# Altium footprint library 2.50-TO直插元件封装.PcbLib: 59 footprints (part 1 of 4)
Each footprint in its own frame and in the unit in brackets; x right, y up, seen from the top. Pads: shape width x height; smd on the part's side, far side on the other; paste and mask are expansions set on the pad; w line width, h text height; cw(c..) or ccw(c..) is an arc to the next point about the centre after c.
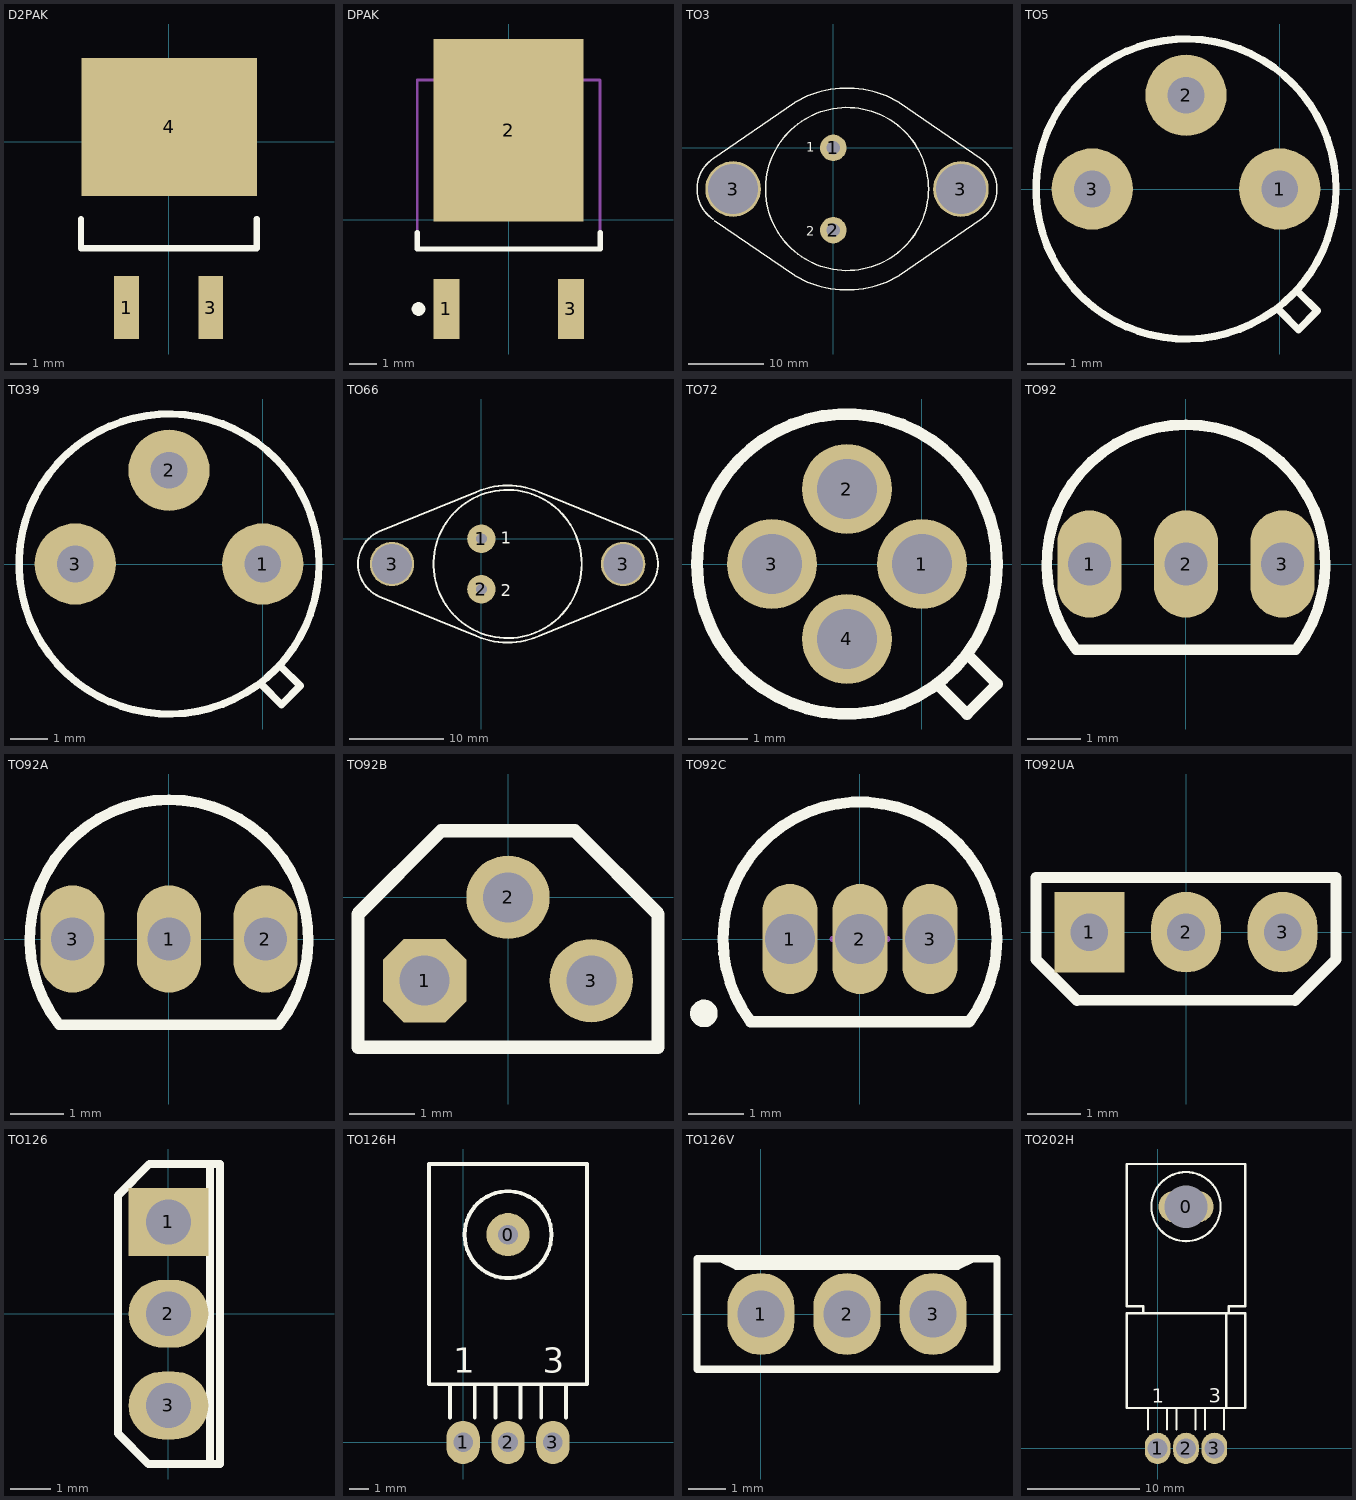
[diagram p0: the footprints below, top view; thin cyan lines are the x and y axes]

## D2PAK [mil] "封装库来自淘宝卖家 ID：黄晶宝石"
pads (3):
  rect 59.06x150 smd: 1(-101,-397) 3(100,-397)
  rect 420x330 smd: 4(1,35)
Top Overlay:
  lines w15: -210,-185 -210,-255 210,-255 210,-185
3D body "TO263-2.STEP": height 200.2, standoff 2.64, extent -199.99,-425.71 200.01,175.23

## DPAK [mm]
pads (3):
  rect 0.95x2.2 smd: 1(-2.28,-3.275) 3(2.28,-3.275)
  rect 5.5x6.7 smd: 2(0,3.275)
Top Overlay:
  circle w0.25: c-3.305,-3.275 r0.125
  lines w0.2: -3.35,-0.475 -3.35,-1.075 3.35,-1.075 3.35,-0.475
Mechanical 13:
  lines w0.1: -3.35,-1.075 -3.35,5.125 3.35,5.125 3.35,-1.075 -3.35,-1.075
Mechanical 15:
  lines w0.1: -0.5,1.125 0.5,1.125 ; 0,0.625 0,1.625
3D body "DPAK_TO-252AA.STEP": height 2.37, standoff -0.03, extent -3.367,-3.939 3.367,6.161

## TO3 [mil] "封装库来自淘宝卖家 ID：黄晶宝石"
pads (4):
  round 137.79 hole 70: 1(0,0) 2(0,-430)
  round 290 hole 262: 3(-523.5,-215) 3(666.5,-215)
Top Overlay:
  circle w7.87: c71.5,-215 r425.69
  lines w7.87: -628.5,-56.67 -203.5,235 ; -627.34,-373.9 cw(c-520.17,-215) -627.34,-56.1 ; -620.17,-381.67 -203.5,-665 ; -200.18,-667.16 ccw(c71.5,-215) 343.18,-667.16 ; -200.18,237.16 cw(c71.5,-215) 343.18,237.16 ; 346.5,-665 771.5,-373.33 ; 346.5,235 771.5,-56.67 ; 770.34,-373.9 ccw(c663.17,-215) 770.34,-56.1
  text "2" at -140,-460 h50
  text "1" at -140,-20 h50

## TO5 [mm] "封装库来自淘宝卖家 ID：黄晶宝石"
pads (3):
  round 2.2 hole 1: 1(0,0) 2(-2.54,2.54) 3(-5.08,0)
Top Overlay:
  circle w0.2: c-2.54,0 r4.064
  lines w0.2: 0,-3.302 0.508,-3.81 1.016,-3.302 0.508,-2.794

## TO39 [mm] "封装库来自淘宝卖家 ID：黄晶宝石"
pads (3):
  round 2.2 hole 1: 1(0,0) 2(-2.54,2.54) 3(-5.08,0)
Top Overlay:
  circle w0.2: c-2.54,0 r4.064
  lines w0.2: 0,-3.302 0.508,-3.81 1.016,-3.302 0.508,-2.794

## TO66 [mil] "封装库来自淘宝卖家 ID：黄晶宝石"
pads (4):
  round 118.11 hole 45: 1(0,0) 2(0,-210)
  round 185 hole 165: 3(-372,-105) 3(590,-105)
Top Overlay:
  circle w7.87: c109,-105 r308.33
  lines w7.87: -426,-240 -21,-405 ; -425.99,-239.75 cw(c-366,-105) -425.99,29.75 ; -426,30 -21,195 ; -18.64,-405.7 ccw(c109,-105) 236.64,-405.7 ; -18.64,195.7 cw(c109,-105) 236.64,195.7 ; 239,-405 644,-240 ; 239,195 644,30 ; 643.63,-240.21 ccw(c589,-105) 643.63,30.21
  text "1" at 80,-20 h50
  text "2" at 80,-240 h50

## TO72 [mil] "封装库来自淘宝卖家 ID：黄晶宝石"
pads (4):
  round 60 hole 40: 1(0,0) 2(-50,50) 3(-100,0) 4(-50,-50)
Top Overlay:
  circle w7.87: c-50,0 r100
  lines w7.87: 10,-80 30,-100 50,-80 30,-60

## TO92 [mm] "TO, Flat Index; 3 In-Line, Axial Leads; Body Dia. 4.8mm; Leads 0.48 x 0.5 mm (max)"
height 5.33
pads (3):
  oval 1.2x2 hole 0.8: 1(-1.8,0) 2(0,0) 3(1.8,0)
Top Overlay:
  lines w0.2: -2.049,-1.601 cw(c0,0) 2.049,-1.601 ; -1.99,-1.6 1.99,-1.6
3D body "TO92A.STEP": height 7.6, standoff -3, extent -2.3,-1.3 2.3,2.3

## TO92A [mm] "TO, Flat Index; 3 In-Line, Axial Leads; Body Dia. 4.8mm; Leads 0.48 x 0.5 mm (max)"
height 5.33
pads (3):
  oval 1.2x2 hole 0.8: 1(0,0) 2(1.8,0) 3(-1.8,0)
Top Overlay:
  lines w0.2: -2.049,-1.601 cw(c0,0) 2.049,-1.601 ; -1.99,-1.6 1.99,-1.6
3D body "TO92A.STEP": height 7.6, standoff -3, extent -2.3,-1.3 2.3,2.3

## TO92B [mil] "92晶体管"
pads (3):
  oct 50x50 hole 30: 1(-50,-50)
  round 50 hole 30: 2(0,0) 3(50,-50)
Top Overlay:
  lines w8: -90,-90 -90,-10 -40,40 40,40 90,-10 90,-90 -90,-90
3D body "TO92B.STEP": height 118.11, standoff -299.21, extent -90.55,-100.99 90.55,40.34

## TO92C [mm] "TO, Flat Index; 3 In-Line, Axial Leads; Body Dia. 4.5mm; Leads 0.51 x 0.48 mm (max)"
height 6.86
pads (3):
  oval 1x2 hole 0.9: 1(-1.27,0) 2(0,0) 3(1.27,0)
Top Overlay:
  circle w0.25: c-2.83,-1.35 r0.125
  lines w0.2: -1.981,-1.5 1.956,-1.5 ; -1.98,-1.5 cw(c0,0) 1.98,-1.5
Mechanical 13:
  lines w0.1: -1.98,-1.5 1.98,-1.5
Mechanical 15:
  lines w0.1: -0.5,0 0.5,0 ; 0,-0.5 0,0.5
3D body "TO-92-2.STEP": height 6.55, standoff -7.65, extent -2.395,-1.524 2.395,2.476

## TO92UA [mm] "92晶体管"
height 5.33
pads (3):
  rect 1.3x1.5 hole 0.7: 1(-1.8,0)
  oval 1.3x1.5 hole 0.7: 2(0,0) 3(1.8,0)
Top Overlay:
  lines w0.2: -2.032,-1.27 2.032,-1.27
  lines w0.203: -2.032,-1.27 -2.794,-0.508 -2.794,1.016 2.794,1.016 2.794,-0.508 2.032,-1.27
3D body "TO92UA_A.STEP": height 6, standoff -3, extent -2.05,-0.95 2.05,0.6

## TO126 [mm] "126晶体管  封装库来自淘宝卖家 ID：黄晶宝石"
pads (3):
  rect 2x1.7 hole 1.12: 1(0,2.3)
  oval 2x1.7 hole 1.12: 2(0,0) 3(0,-2.3)
Top Overlay:
  lines w0.2: 1.041,-3.734 1.041,3.734 ; -1.268,-3.005 -0.506,-3.767 1.295,-3.767 1.295,3.752 -0.48,3.752 -1.268,2.964 -1.268,-3.005
3D body "TO126.STEP": height 4, standoff -15, extent -1.2,-4 1.6,4

## TO126H [mm] "封装库来自淘宝卖家 ID：黄晶宝石"
pads (4):
  round 2.2 hole 1: 0(2.286,10.583)
  oval 1.7x2.2 hole 1: 1(0,0) 2(2.286,0) 3(4.572,0)
Top Overlay:
  circle w0.2: c2.286,10.583 r2.214
  lines w0.2: -0.677,1.27 -0.677,2.963 ; 0.593,1.27 0.593,2.963 ; 1.651,1.27 1.651,2.963 ; 2.921,1.27 2.921,2.963 ; 3.979,1.27 3.979,2.963 ; 5.249,1.27 5.249,2.963 ; -0.677,2.963 -1.736,2.963 -1.736,14.182 6.308,14.182 6.308,2.963 -0.677,2.963
  text "3" at 4.064,3.556 h1.27
  text "1" at -0.508,3.556 h1.27

## TO126V [mm] "封装库来自淘宝卖家 ID：黄晶宝石"
pads (3):
  oval 1.8x2.2 hole 1.27: 1(0,0) 2(2.307,0) 3(4.614,0)
Top Overlay:
  lines w0.2: -1.079,1.482 -0.656,1.282 5.27,1.282 5.694,1.482 ; -1.714,-1.482 6.329,-1.482 6.329,1.482 -1.714,1.482 -1.714,-1.482
3D body "TO126.STEP": height 4, standoff -15, extent -1.693,-1.2 6.307,1.6

## TO202H [mil]
pads (4):
  oval 195x110.24 hole 150: 0(100,850)
  oval 90x110.24 hole 70: 1(0,0) 2(100,0) 3(200,0)
Top Overlay:
  circle w7.87: c100,850 r121.66
  lines w7.87: -50,475 -50,500 -108.33,500 -108.33,1000 308.33,1000 308.33,500 250,500 250,475 ; -33.33,66.93 -33.33,141.67 ; 33.33,66.93 33.33,141.67 ; 66.67,66.93 66.67,141.67 ; 133.33,66.93 133.33,141.67 ; 166.67,66.93 166.67,141.67 ; 233.33,66.93 233.33,141.67 ; 241.67,141.67 241.67,475 ; -108.33,141.67 -108.33,475 308.33,475 308.33,141.67 -108.33,141.67
  text "1" at -20,160 h50
  text "3" at 180,160 h50